# Altium integrated library Weidmueller_OMNIMATE_Power.IntLib: 508 symbols (part 8 of 9) (continued)
## 1930280000 (continued)
OMNIMATE Power - series BV/SV 7.62HP; PartNumber: 1930280000; Manufacturer: Weidmueller; Short_text_for_material: SV 7.62HP/03/90G 3.5SN BK BX; Side_termination_characteristic: closed side; Mounting_onto_the_PCB: Solder connection; Pitch_mm: 7.62 mm; Pitch_inch: 0.3 inch; No_of_poles: 3; Outgoing_elbow: 90°; Solder_pin_length_mm: 3.5 mm; Contact_material: Cu-Leg; Contact_surface: tinned; Insulating_material: PA GF; UL_94_flammability_rating: V-0; Rated_voltage_for_surge_voltage_class_pollution_degree_II_2: 1000 V; Rated_voltage_use_group_B_UL_1059: 300 V; Rated_current_use_group_B_UL_1059: 40.5 A; PackageReference: SV_7_62HP_90G_03; Colour: Black; Packaging: Box; Qty: 78 PCS; Revision: V1; ComponentLink1Description: Manufacturer URL; ComponentLink1URL: http://www.weidmueller.com/; ComponentLink2Description: URL Link1; ComponentLink2URL: http://catalog.weidmueller.com/catalog/Start.do?localeId=en&ObjectID=1930280000
footprint SV_7_62HP_90G_03 (OMNIMATE Power - Serie BV/SV 7.62HP  SV 7.62HP/03/90G 3.5)
pins: A1, A2, A3

## 1930280000_Single
designator J?
OMNIMATE Power - series BV/SV 7.62HP; PartNumber: 1930280000; Manufacturer: Weidmueller; Short_text_for_material: SV 7.62HP/03/90G 3.5SN BK BX; Side_termination_characteristic: closed side; Mounting_onto_the_PCB: Solder connection; Pitch_mm: 7.62 mm; Pitch_inch: 0.3 inch; No_of_poles: 3; Outgoing_elbow: 90°; Solder_pin_length_mm: 3.5 mm; Contact_material: Cu-Leg; Contact_surface: tinned; Insulating_material: PA GF; UL_94_flammability_rating: V-0; Rated_voltage_for_surge_voltage_class_pollution_degree_II_2: 1000 V; Rated_voltage_use_group_B_UL_1059: 300 V; Rated_current_use_group_B_UL_1059: 40.5 A; PackageReference: SV_7_62HP_90G_03; Colour: Black; Packaging: Box; Qty: 78 PCS; Revision: V1; ComponentLink1Description: Manufacturer URL; ComponentLink1URL: http://www.weidmueller.com/; ComponentLink2Description: URL Link1; ComponentLink2URL: http://catalog.weidmueller.com/catalog/Start.do?localeId=en&ObjectID=1930280000
footprint SV_7_62HP_90G_03 (OMNIMATE Power - Serie BV/SV 7.62HP  SV 7.62HP/03/90G 3.5)
part A pins: A1
part B pins: A2
part C pins: A3

## 1930290000
designator J?
OMNIMATE Power - series BV/SV 7.62HP; PartNumber: 1930290000; Manufacturer: Weidmueller; Short_text_for_material: SV 7.62HP/04/90G 3.5SN BK BX; Side_termination_characteristic: closed side; Mounting_onto_the_PCB: Solder connection; Pitch_mm: 7.62 mm; Pitch_inch: 0.3 inch; No_of_poles: 4; Outgoing_elbow: 90°; Solder_pin_length_mm: 3.5 mm; Contact_material: Cu-Leg; Contact_surface: tinned; Insulating_material: PA GF; UL_94_flammability_rating: V-0; Rated_voltage_for_surge_voltage_class_pollution_degree_II_2: 1000 V; Rated_voltage_use_group_B_UL_1059: 300 V; Rated_current_use_group_B_UL_1059: 40.5 A; PackageReference: SV_7_62HP_90G_04; Colour: Black; Packaging: Box; Qty: 60 PCS; Revision: V1; ComponentLink1Description: Manufacturer URL; ComponentLink1URL: http://www.weidmueller.com/; ComponentLink2Description: URL Link1; ComponentLink2URL: http://catalog.weidmueller.com/catalog/Start.do?localeId=en&ObjectID=1930290000
footprint SV_7_62HP_90G_04 (OMNIMATE Power - Serie BV/SV 7.62HP  SV 7.62HP/04/90G 3.5)
pins: A1, A2, A3, A4

## 1930290000_Single
designator J?
OMNIMATE Power - series BV/SV 7.62HP; PartNumber: 1930290000; Manufacturer: Weidmueller; Short_text_for_material: SV 7.62HP/04/90G 3.5SN BK BX; Side_termination_characteristic: closed side; Mounting_onto_the_PCB: Solder connection; Pitch_mm: 7.62 mm; Pitch_inch: 0.3 inch; No_of_poles: 4; Outgoing_elbow: 90°; Solder_pin_length_mm: 3.5 mm; Contact_material: Cu-Leg; Contact_surface: tinned; Insulating_material: PA GF; UL_94_flammability_rating: V-0; Rated_voltage_for_surge_voltage_class_pollution_degree_II_2: 1000 V; Rated_voltage_use_group_B_UL_1059: 300 V; Rated_current_use_group_B_UL_1059: 40.5 A; PackageReference: SV_7_62HP_90G_04; Colour: Black; Packaging: Box; Qty: 60 PCS; Revision: V1; ComponentLink1Description: Manufacturer URL; ComponentLink1URL: http://www.weidmueller.com/; ComponentLink2Description: URL Link1; ComponentLink2URL: http://catalog.weidmueller.com/catalog/Start.do?localeId=en&ObjectID=1930290000
footprint SV_7_62HP_90G_04 (OMNIMATE Power - Serie BV/SV 7.62HP  SV 7.62HP/04/90G 3.5)
part A pins: A1
part B pins: A2
part C pins: A3
part D pins: A4

## 1930380000
designator J?
OMNIMATE Power - series BV/SV 7.62HP; PartNumber: 1930380000; Manufacturer: Weidmueller; Short_text_for_material: SV 7.62HP/02/90F 3.5SN BK BX; Side_termination_characteristic: Clip-on flange; Mounting_onto_the_PCB: Solder connection; Pitch_mm: 7.62 mm; Pitch_inch: 0.3 inch; No_of_poles: 2; Outgoing_elbow: 90°; Solder_pin_length_mm: 3.5 mm; Contact_material: Cu-Leg; Contact_surface: tinned; Insulating_material: PA GF; UL_94_flammability_rating: V-0; Rated_voltage_for_surge_voltage_class_pollution_degree_II_2: 1000 V; Rated_voltage_use_group_B_UL_1059: 300 V; Rated_current_use_group_B_UL_1059: 40.5 A; PackageReference: SV_7_62HP_90F_02; Colour: Black; Packaging: Box; Qty: 100 PCS; Revision: V1; ComponentLink1Description: Manufacturer URL; ComponentLink1URL: http://www.weidmueller.com/; ComponentLink2Description: URL Link1; ComponentLink2URL: http://catalog.weidmueller.com/catalog/Start.do?localeId=en&ObjectID=1930380000
footprint SV_7_62HP_90F_02 (OMNIMATE Power - Serie BV/SV 7.62HP  SV 7.62HP/02/90F 3.5)
pins: A1, A2

## 1930380000_Single
designator J?
OMNIMATE Power - series BV/SV 7.62HP; PartNumber: 1930380000; Manufacturer: Weidmueller; Short_text_for_material: SV 7.62HP/02/90F 3.5SN BK BX; Side_termination_characteristic: Clip-on flange; Mounting_onto_the_PCB: Solder connection; Pitch_mm: 7.62 mm; Pitch_inch: 0.3 inch; No_of_poles: 2; Outgoing_elbow: 90°; Solder_pin_length_mm: 3.5 mm; Contact_material: Cu-Leg; Contact_surface: tinned; Insulating_material: PA GF; UL_94_flammability_rating: V-0; Rated_voltage_for_surge_voltage_class_pollution_degree_II_2: 1000 V; Rated_voltage_use_group_B_UL_1059: 300 V; Rated_current_use_group_B_UL_1059: 40.5 A; PackageReference: SV_7_62HP_90F_02; Colour: Black; Packaging: Box; Qty: 100 PCS; Revision: V1; ComponentLink1Description: Manufacturer URL; ComponentLink1URL: http://www.weidmueller.com/; ComponentLink2Description: URL Link1; ComponentLink2URL: http://catalog.weidmueller.com/catalog/Start.do?localeId=en&ObjectID=1930380000
footprint SV_7_62HP_90F_02 (OMNIMATE Power - Serie BV/SV 7.62HP  SV 7.62HP/02/90F 3.5)
part A pins: A1
part B pins: A2

## 1930390000
designator J?
OMNIMATE Power - series BV/SV 7.62HP; PartNumber: 1930390000; Manufacturer: Weidmueller; Short_text_for_material: SV 7.62HP/03/90F 3.5SN BK BX; Side_termination_characteristic: Clip-on flange; Mounting_onto_the_PCB: Solder connection; Pitch_mm: 7.62 mm; Pitch_inch: 0.3 inch; No_of_poles: 3; Outgoing_elbow: 90°; Solder_pin_length_mm: 3.5 mm; Contact_material: Cu-Leg; Contact_surface: tinned; Insulating_material: PA GF; UL_94_flammability_rating: V-0; Rated_voltage_for_surge_voltage_class_pollution_degree_II_2: 1000 V; Rated_voltage_use_group_B_UL_1059: 300 V; Rated_current_use_group_B_UL_1059: 40.5 A; PackageReference: SV_7_62HP_90F_03; Colour: Black; Packaging: Box; Qty: 48 PCS; Revision: V1; ComponentLink1Description: Manufacturer URL; ComponentLink1URL: http://www.weidmueller.com/; ComponentLink2Description: URL Link1; ComponentLink2URL: http://catalog.weidmueller.com/catalog/Start.do?localeId=en&ObjectID=1930390000
footprint SV_7_62HP_90F_03 (OMNIMATE Power - Serie BV/SV 7.62HP  SV 7.62HP/03/90F 3.5)
pins: A1, A2, A3

## 1930390000_Single
designator J?
OMNIMATE Power - series BV/SV 7.62HP; PartNumber: 1930390000; Manufacturer: Weidmueller; Short_text_for_material: SV 7.62HP/03/90F 3.5SN BK BX; Side_termination_characteristic: Clip-on flange; Mounting_onto_the_PCB: Solder connection; Pitch_mm: 7.62 mm; Pitch_inch: 0.3 inch; No_of_poles: 3; Outgoing_elbow: 90°; Solder_pin_length_mm: 3.5 mm; Contact_material: Cu-Leg; Contact_surface: tinned; Insulating_material: PA GF; UL_94_flammability_rating: V-0; Rated_voltage_for_surge_voltage_class_pollution_degree_II_2: 1000 V; Rated_voltage_use_group_B_UL_1059: 300 V; Rated_current_use_group_B_UL_1059: 40.5 A; PackageReference: SV_7_62HP_90F_03; Colour: Black; Packaging: Box; Qty: 48 PCS; Revision: V1; ComponentLink1Description: Manufacturer URL; ComponentLink1URL: http://www.weidmueller.com/; ComponentLink2Description: URL Link1; ComponentLink2URL: http://catalog.weidmueller.com/catalog/Start.do?localeId=en&ObjectID=1930390000
footprint SV_7_62HP_90F_03 (OMNIMATE Power - Serie BV/SV 7.62HP  SV 7.62HP/03/90F 3.5)
part A pins: A1
part B pins: A2
part C pins: A3

## 1930400000
designator J?
OMNIMATE Power - series BV/SV 7.62HP; PartNumber: 1930400000; Manufacturer: Weidmueller; Short_text_for_material: SV 7.62HP/04/90F 3.5SN BK BX; Side_termination_characteristic: Clip-on flange; Mounting_onto_the_PCB: Solder connection; Pitch_mm: 7.62 mm; Pitch_inch: 0.3 inch; No_of_poles: 4; Outgoing_elbow: 90°; Solder_pin_length_mm: 3.5 mm; Contact_material: Cu-Leg; Contact_surface: tinned; Insulating_material: PA GF; UL_94_flammability_rating: V-0; Rated_voltage_for_surge_voltage_class_pollution_degree_II_2: 1000 V; Rated_voltage_use_group_B_UL_1059: 300 V; Rated_current_use_group_B_UL_1059: 40.5 A; PackageReference: SV_7_62HP_90F_04; Colour: Black; Packaging: Box; Qty: 36 PCS; Revision: V1; ComponentLink1Description: Manufacturer URL; ComponentLink1URL: http://www.weidmueller.com/; ComponentLink2Description: URL Link1; ComponentLink2URL: http://catalog.weidmueller.com/catalog/Start.do?localeId=en&ObjectID=1930400000
footprint SV_7_62HP_90F_04 (OMNIMATE Power - Serie BV/SV 7.62HP  SV 7.62HP/04/90F 3.5)
pins: A1, A2, A3, A4

## 1930400000_Single
designator J?
OMNIMATE Power - series BV/SV 7.62HP; PartNumber: 1930400000; Manufacturer: Weidmueller; Short_text_for_material: SV 7.62HP/04/90F 3.5SN BK BX; Side_termination_characteristic: Clip-on flange; Mounting_onto_the_PCB: Solder connection; Pitch_mm: 7.62 mm; Pitch_inch: 0.3 inch; No_of_poles: 4; Outgoing_elbow: 90°; Solder_pin_length_mm: 3.5 mm; Contact_material: Cu-Leg; Contact_surface: tinned; Insulating_material: PA GF; UL_94_flammability_rating: V-0; Rated_voltage_for_surge_voltage_class_pollution_degree_II_2: 1000 V; Rated_voltage_use_group_B_UL_1059: 300 V; Rated_current_use_group_B_UL_1059: 40.5 A; PackageReference: SV_7_62HP_90F_04; Colour: Black; Packaging: Box; Qty: 36 PCS; Revision: V1; ComponentLink1Description: Manufacturer URL; ComponentLink1URL: http://www.weidmueller.com/; ComponentLink2Description: URL Link1; ComponentLink2URL: http://catalog.weidmueller.com/catalog/Start.do?localeId=en&ObjectID=1930400000
footprint SV_7_62HP_90F_04 (OMNIMATE Power - Serie BV/SV 7.62HP  SV 7.62HP/04/90F 3.5)
part A pins: A1
part B pins: A2
part C pins: A3
part D pins: A4

## 1930490000
designator J?
OMNIMATE Power - series BV/SV 7.62HP; PartNumber: 1930490000; Manufacturer: Weidmueller; Short_text_for_material: SV 7.62HP/02/90SF 3.5SN BK BX; Side_termination_characteristic: Screw/clip-on flange; Mounting_onto_the_PCB: Solder connection; Pitch_mm: 7.62 mm; Pitch_inch: 0.3 inch; No_of_poles: 2; Outgoing_elbow: 90°; Solder_pin_length_mm: 3.5 mm; Contact_material: Cu-Leg; Contact_surface: tinned; Insulating_material: PA GF; UL_94_flammability_rating: V-0; Rated_voltage_for_surge_voltage_class_pollution_degree_II_2: 1000 V; Rated_voltage_use_group_B_UL_1059: 300 V; Rated_current_use_group_B_UL_1059: 40.5 A; PackageReference: SV_7_62HP_90SF_02; Colour: Black; Packaging: Box; Qty: 100 PCS; Revision: V1; ComponentLink1Description: Manufacturer URL; ComponentLink1URL: http://www.weidmueller.com/; ComponentLink2Description: URL Link1; ComponentLink2URL: http://catalog.weidmueller.com/catalog/Start.do?localeId=en&ObjectID=1930490000
footprint SV_7_62HP_90SF_02 (OMNIMATE Power - Serie BV/SV 7.62HP  SV 7.62HP/02/90SF 3.5)
pins: A1, A2

## 1930490000_Single
designator J?
OMNIMATE Power - series BV/SV 7.62HP; PartNumber: 1930490000; Manufacturer: Weidmueller; Short_text_for_material: SV 7.62HP/02/90SF 3.5SN BK BX; Side_termination_characteristic: Screw/clip-on flange; Mounting_onto_the_PCB: Solder connection; Pitch_mm: 7.62 mm; Pitch_inch: 0.3 inch; No_of_poles: 2; Outgoing_elbow: 90°; Solder_pin_length_mm: 3.5 mm; Contact_material: Cu-Leg; Contact_surface: tinned; Insulating_material: PA GF; UL_94_flammability_rating: V-0; Rated_voltage_for_surge_voltage_class_pollution_degree_II_2: 1000 V; Rated_voltage_use_group_B_UL_1059: 300 V; Rated_current_use_group_B_UL_1059: 40.5 A; PackageReference: SV_7_62HP_90SF_02; Colour: Black; Packaging: Box; Qty: 100 PCS; Revision: V1; ComponentLink1Description: Manufacturer URL; ComponentLink1URL: http://www.weidmueller.com/; ComponentLink2Description: URL Link1; ComponentLink2URL: http://catalog.weidmueller.com/catalog/Start.do?localeId=en&ObjectID=1930490000
footprint SV_7_62HP_90SF_02 (OMNIMATE Power - Serie BV/SV 7.62HP  SV 7.62HP/02/90SF 3.5)
part A pins: A1
part B pins: A2

## 1930500000
designator J?
OMNIMATE Power - series BV/SV 7.62HP; PartNumber: 1930500000; Manufacturer: Weidmueller; Short_text_for_material: SV 7.62HP/03/90SF 3.5SN BK BX; Side_termination_characteristic: Screw/clip-on flange; Mounting_onto_the_PCB: Solder connection; Pitch_mm: 7.62 mm; Pitch_inch: 0.3 inch; No_of_poles: 3; Outgoing_elbow: 90°; Solder_pin_length_mm: 3.5 mm; Contact_material: Cu-Leg; Contact_surface: tinned; Insulating_material: PA GF; UL_94_flammability_rating: V-0; Rated_voltage_for_surge_voltage_class_pollution_degree_II_2: 1000 V; Rated_voltage_use_group_B_UL_1059: 300 V; Rated_current_use_group_B_UL_1059: 40.5 A; PackageReference: SV_7_62HP_90SF_03; Colour: Black; Packaging: Box; Qty: 100 PCS; Revision: V1; ComponentLink1Description: Manufacturer URL; ComponentLink1URL: http://www.weidmueller.com/; ComponentLink2Description: URL Link1; ComponentLink2URL: http://catalog.weidmueller.com/catalog/Start.do?localeId=en&ObjectID=1930500000
footprint SV_7_62HP_90SF_03 (OMNIMATE Power - Serie BV/SV 7.62HP  SV 7.62HP/03/90SF 3.5)
pins: A1, A2, A3

## 1930500000_Single
designator J?
OMNIMATE Power - series BV/SV 7.62HP; PartNumber: 1930500000; Manufacturer: Weidmueller; Short_text_for_material: SV 7.62HP/03/90SF 3.5SN BK BX; Side_termination_characteristic: Screw/clip-on flange; Mounting_onto_the_PCB: Solder connection; Pitch_mm: 7.62 mm; Pitch_inch: 0.3 inch; No_of_poles: 3; Outgoing_elbow: 90°; Solder_pin_length_mm: 3.5 mm; Contact_material: Cu-Leg; Contact_surface: tinned; Insulating_material: PA GF; UL_94_flammability_rating: V-0; Rated_voltage_for_surge_voltage_class_pollution_degree_II_2: 1000 V; Rated_voltage_use_group_B_UL_1059: 300 V; Rated_current_use_group_B_UL_1059: 40.5 A; PackageReference: SV_7_62HP_90SF_03; Colour: Black; Packaging: Box; Qty: 100 PCS; Revision: V1; ComponentLink1Description: Manufacturer URL; ComponentLink1URL: http://www.weidmueller.com/; ComponentLink2Description: URL Link1; ComponentLink2URL: http://catalog.weidmueller.com/catalog/Start.do?localeId=en&ObjectID=1930500000
footprint SV_7_62HP_90SF_03 (OMNIMATE Power - Serie BV/SV 7.62HP  SV 7.62HP/03/90SF 3.5)
part A pins: A1
part B pins: A2
part C pins: A3

## 1930510000
designator J?
OMNIMATE Power - series BV/SV 7.62HP; PartNumber: 1930510000; Manufacturer: Weidmueller; Short_text_for_material: SV 7.62HP/04/90SF 3.5SN BK BX; Side_termination_characteristic: Screw/clip-on flange; Mounting_onto_the_PCB: Solder connection; Pitch_mm: 7.62 mm; Pitch_inch: 0.3 inch; No_of_poles: 4; Outgoing_elbow: 90°; Solder_pin_length_mm: 3.5 mm; Contact_material: Cu-Leg; Contact_surface: tinned; Insulating_material: PA GF; UL_94_flammability_rating: V-0; Rated_voltage_for_surge_voltage_class_pollution_degree_II_2: 1000 V; Rated_voltage_use_group_B_UL_1059: 300 V; Rated_current_use_group_B_UL_1059: 40.5 A; PackageReference: SV_7_62HP_90SF_04; Colour: Black; Packaging: Box; Qty: 100 PCS; Revision: V1; ComponentLink1Description: Manufacturer URL; ComponentLink1URL: http://www.weidmueller.com/; ComponentLink2Description: URL Link1; ComponentLink2URL: http://catalog.weidmueller.com/catalog/Start.do?localeId=en&ObjectID=1930510000
footprint SV_7_62HP_90SF_04 (OMNIMATE Power - Serie BV/SV 7.62HP  SV 7.62HP/04/90SF 3.5)
pins: A1, A2, A3, A4

## 1930510000_Single
designator J?
OMNIMATE Power - series BV/SV 7.62HP; PartNumber: 1930510000; Manufacturer: Weidmueller; Short_text_for_material: SV 7.62HP/04/90SF 3.5SN BK BX; Side_termination_characteristic: Screw/clip-on flange; Mounting_onto_the_PCB: Solder connection; Pitch_mm: 7.62 mm; Pitch_inch: 0.3 inch; No_of_poles: 4; Outgoing_elbow: 90°; Solder_pin_length_mm: 3.5 mm; Contact_material: Cu-Leg; Contact_surface: tinned; Insulating_material: PA GF; UL_94_flammability_rating: V-0; Rated_voltage_for_surge_voltage_class_pollution_degree_II_2: 1000 V; Rated_voltage_use_group_B_UL_1059: 300 V; Rated_current_use_group_B_UL_1059: 40.5 A; PackageReference: SV_7_62HP_90SF_04; Colour: Black; Packaging: Box; Qty: 100 PCS; Revision: V1; ComponentLink1Description: Manufacturer URL; ComponentLink1URL: http://www.weidmueller.com/; ComponentLink2Description: URL Link1; ComponentLink2URL: http://catalog.weidmueller.com/catalog/Start.do?localeId=en&ObjectID=1930510000
footprint SV_7_62HP_90SF_04 (OMNIMATE Power - Serie BV/SV 7.62HP  SV 7.62HP/04/90SF 3.5)
part A pins: A1
part B pins: A2
part C pins: A3
part D pins: A4

## 1930600000
designator J?
OMNIMATE Power - series BV/SV 7.62HP; PartNumber: 1930600000; Manufacturer: Weidmueller; Short_text_for_material: SV 7.62HP/02/180G 3.5SN BK BX; Side_termination_characteristic: closed side; Mounting_onto_the_PCB: Solder connection; Pitch_mm: 7.62 mm; Pitch_inch: 0.3 inch; No_of_poles: 2; Outgoing_elbow: 180°; Solder_pin_length_mm: 3.5 mm; Contact_material: Cu-Leg; Contact_surface: tinned; Insulating_material: PA GF; UL_94_flammability_rating: V-0; Rated_voltage_for_surge_voltage_class_pollution_degree_II_2: 1000 V; Rated_voltage_use_group_B_UL_1059: 300 V; Rated_current_use_group_B_UL_1059: 40.5 A; PackageReference: SV_7_62HP_180G_02; Colour: Black; Packaging: Box; Qty: 120 PCS; Revision: V1; ComponentLink1Description: Manufacturer URL; ComponentLink1URL: http://www.weidmueller.com/; ComponentLink2Description: URL Link1; ComponentLink2URL: http://catalog.weidmueller.com/catalog/Start.do?localeId=en&ObjectID=1930600000
footprint SV_7_62HP_180G_02 (OMNIMATE Power - Serie BV/SV 7.62HP  SV 7.62HP/02/180G 3.5)
pins: A1, A2

## 1930600000_Single
designator J?
OMNIMATE Power - series BV/SV 7.62HP; PartNumber: 1930600000; Manufacturer: Weidmueller; Short_text_for_material: SV 7.62HP/02/180G 3.5SN BK BX; Side_termination_characteristic: closed side; Mounting_onto_the_PCB: Solder connection; Pitch_mm: 7.62 mm; Pitch_inch: 0.3 inch; No_of_poles: 2; Outgoing_elbow: 180°; Solder_pin_length_mm: 3.5 mm; Contact_material: Cu-Leg; Contact_surface: tinned; Insulating_material: PA GF; UL_94_flammability_rating: V-0; Rated_voltage_for_surge_voltage_class_pollution_degree_II_2: 1000 V; Rated_voltage_use_group_B_UL_1059: 300 V; Rated_current_use_group_B_UL_1059: 40.5 A; PackageReference: SV_7_62HP_180G_02; Colour: Black; Packaging: Box; Qty: 120 PCS; Revision: V1; ComponentLink1Description: Manufacturer URL; ComponentLink1URL: http://www.weidmueller.com/; ComponentLink2Description: URL Link1; ComponentLink2URL: http://catalog.weidmueller.com/catalog/Start.do?localeId=en&ObjectID=1930600000
footprint SV_7_62HP_180G_02 (OMNIMATE Power - Serie BV/SV 7.62HP  SV 7.62HP/02/180G 3.5)
part A pins: A1
part B pins: A2

## 1930610000
designator J?
OMNIMATE Power - series BV/SV 7.62HP; PartNumber: 1930610000; Manufacturer: Weidmueller; Short_text_for_material: SV 7.62HP/03/180G 3.5SN BK BX; Side_termination_characteristic: closed side; Mounting_onto_the_PCB: Solder connection; Pitch_mm: 7.62 mm; Pitch_inch: 0.3 inch; No_of_poles: 3; Outgoing_elbow: 180°; Solder_pin_length_mm: 3.5 mm; Contact_material: Cu-Leg; Contact_surface: tinned; Insulating_material: PA GF; UL_94_flammability_rating: V-0; Rated_voltage_for_surge_voltage_class_pollution_degree_II_2: 1000 V; Rated_voltage_use_group_B_UL_1059: 300 V; Rated_current_use_group_B_UL_1059: 40.5 A; PackageReference: SV_7_62HP_180G_03; Colour: Black; Packaging: Box; Qty: 78 PCS; Revision: V1; ComponentLink1Description: Manufacturer URL; ComponentLink1URL: http://www.weidmueller.com/; ComponentLink2Description: URL Link1; ComponentLink2URL: http://catalog.weidmueller.com/catalog/Start.do?localeId=en&ObjectID=1930610000
footprint SV_7_62HP_180G_03 (OMNIMATE Power - Serie BV/SV 7.62HP  SV 7.62HP/03/180G 3.5)
pins: A1, A2, A3

## 1930610000_Single
designator J?
OMNIMATE Power - series BV/SV 7.62HP; PartNumber: 1930610000; Manufacturer: Weidmueller; Short_text_for_material: SV 7.62HP/03/180G 3.5SN BK BX; Side_termination_characteristic: closed side; Mounting_onto_the_PCB: Solder connection; Pitch_mm: 7.62 mm; Pitch_inch: 0.3 inch; No_of_poles: 3; Outgoing_elbow: 180°; Solder_pin_length_mm: 3.5 mm; Contact_material: Cu-Leg; Contact_surface: tinned; Insulating_material: PA GF; UL_94_flammability_rating: V-0; Rated_voltage_for_surge_voltage_class_pollution_degree_II_2: 1000 V; Rated_voltage_use_group_B_UL_1059: 300 V; Rated_current_use_group_B_UL_1059: 40.5 A; PackageReference: SV_7_62HP_180G_03; Colour: Black; Packaging: Box; Qty: 78 PCS; Revision: V1; ComponentLink1Description: Manufacturer URL; ComponentLink1URL: http://www.weidmueller.com/; ComponentLink2Description: URL Link1; ComponentLink2URL: http://catalog.weidmueller.com/catalog/Start.do?localeId=en&ObjectID=1930610000
footprint SV_7_62HP_180G_03 (OMNIMATE Power - Serie BV/SV 7.62HP  SV 7.62HP/03/180G 3.5)
part A pins: A1
part B pins: A2
part C pins: A3

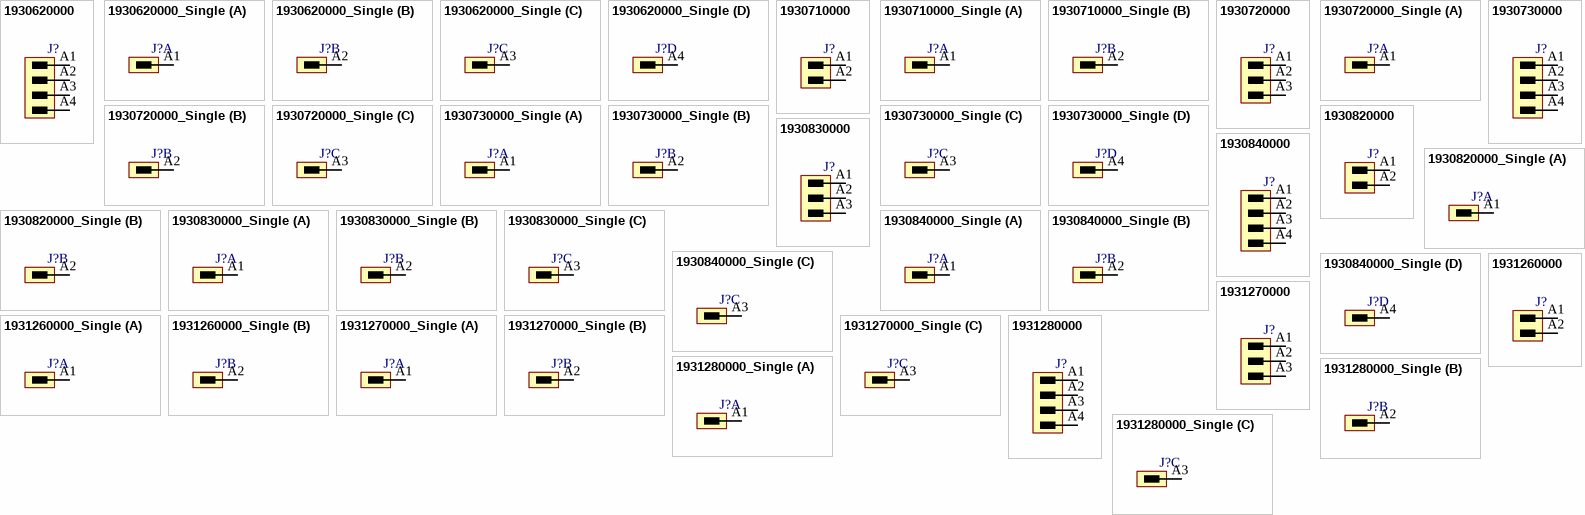
[diagram p29: symbols 1930620000 to 1931280000_Single]

## 1930620000
designator J?
OMNIMATE Power - series BV/SV 7.62HP; PartNumber: 1930620000; Manufacturer: Weidmueller; Short_text_for_material: SV 7.62HP/04/180G 3.5SN BK BX; Side_termination_characteristic: closed side; Mounting_onto_the_PCB: Solder connection; Pitch_mm: 7.62 mm; Pitch_inch: 0.3 inch; No_of_poles: 4; Outgoing_elbow: 180°; Solder_pin_length_mm: 3.5 mm; Contact_material: Cu-Leg; Contact_surface: tinned; Insulating_material: PA GF; UL_94_flammability_rating: V-0; Rated_voltage_for_surge_voltage_class_pollution_degree_II_2: 1000 V; Rated_voltage_use_group_B_UL_1059: 300 V; Rated_current_use_group_B_UL_1059: 40.5 A; PackageReference: SV_7_62HP_180G_04; Colour: Black; Packaging: Box; Qty: 60 PCS; Revision: V1; ComponentLink1Description: Manufacturer URL; ComponentLink1URL: http://www.weidmueller.com/; ComponentLink2Description: URL Link1; ComponentLink2URL: http://catalog.weidmueller.com/catalog/Start.do?localeId=en&ObjectID=1930620000
footprint SV_7_62HP_180G_04 (OMNIMATE Power - Serie BV/SV 7.62HP  SV 7.62HP/04/180G 3.5)
pins: A1, A2, A3, A4

## 1930620000_Single
designator J?
OMNIMATE Power - series BV/SV 7.62HP; PartNumber: 1930620000; Manufacturer: Weidmueller; Short_text_for_material: SV 7.62HP/04/180G 3.5SN BK BX; Side_termination_characteristic: closed side; Mounting_onto_the_PCB: Solder connection; Pitch_mm: 7.62 mm; Pitch_inch: 0.3 inch; No_of_poles: 4; Outgoing_elbow: 180°; Solder_pin_length_mm: 3.5 mm; Contact_material: Cu-Leg; Contact_surface: tinned; Insulating_material: PA GF; UL_94_flammability_rating: V-0; Rated_voltage_for_surge_voltage_class_pollution_degree_II_2: 1000 V; Rated_voltage_use_group_B_UL_1059: 300 V; Rated_current_use_group_B_UL_1059: 40.5 A; PackageReference: SV_7_62HP_180G_04; Colour: Black; Packaging: Box; Qty: 60 PCS; Revision: V1; ComponentLink1Description: Manufacturer URL; ComponentLink1URL: http://www.weidmueller.com/; ComponentLink2Description: URL Link1; ComponentLink2URL: http://catalog.weidmueller.com/catalog/Start.do?localeId=en&ObjectID=1930620000
footprint SV_7_62HP_180G_04 (OMNIMATE Power - Serie BV/SV 7.62HP  SV 7.62HP/04/180G 3.5)
part A pins: A1
part B pins: A2
part C pins: A3
part D pins: A4

## 1930710000
designator J?
OMNIMATE Power - series BV/SV 7.62HP; PartNumber: 1930710000; Manufacturer: Weidmueller; Short_text_for_material: SV 7.62HP/02/180F 3.5SN BK BX; Side_termination_characteristic: Clip-on flange; Mounting_onto_the_PCB: Solder connection; Pitch_mm: 7.62 mm; Pitch_inch: 0.3 inch; No_of_poles: 2; Outgoing_elbow: 180°; Solder_pin_length_mm: 3.5 mm; Contact_material: Cu-Leg; Contact_surface: tinned; Insulating_material: PA GF; UL_94_flammability_rating: V-0; Rated_voltage_for_surge_voltage_class_pollution_degree_II_2: 1000 V; Rated_voltage_use_group_B_UL_1059: 300 V; Rated_current_use_group_B_UL_1059: 40.5 A; PackageReference: SV_7_62HP_180F_02; Colour: Black; Packaging: Box; Qty: 60 PCS; Revision: V1; ComponentLink1Description: Manufacturer URL; ComponentLink1URL: http://www.weidmueller.com/; ComponentLink2Description: URL Link1; ComponentLink2URL: http://catalog.weidmueller.com/catalog/Start.do?localeId=en&ObjectID=1930710000
footprint SV_7_62HP_180F_02 (OMNIMATE Power - Serie BV/SV 7.62HP  SV 7.62HP/02/180F 3.5)
pins: A1, A2

## 1930710000_Single
designator J?
OMNIMATE Power - series BV/SV 7.62HP; PartNumber: 1930710000; Manufacturer: Weidmueller; Short_text_for_material: SV 7.62HP/02/180F 3.5SN BK BX; Side_termination_characteristic: Clip-on flange; Mounting_onto_the_PCB: Solder connection; Pitch_mm: 7.62 mm; Pitch_inch: 0.3 inch; No_of_poles: 2; Outgoing_elbow: 180°; Solder_pin_length_mm: 3.5 mm; Contact_material: Cu-Leg; Contact_surface: tinned; Insulating_material: PA GF; UL_94_flammability_rating: V-0; Rated_voltage_for_surge_voltage_class_pollution_degree_II_2: 1000 V; Rated_voltage_use_group_B_UL_1059: 300 V; Rated_current_use_group_B_UL_1059: 40.5 A; PackageReference: SV_7_62HP_180F_02; Colour: Black; Packaging: Box; Qty: 60 PCS; Revision: V1; ComponentLink1Description: Manufacturer URL; ComponentLink1URL: http://www.weidmueller.com/; ComponentLink2Description: URL Link1; ComponentLink2URL: http://catalog.weidmueller.com/catalog/Start.do?localeId=en&ObjectID=1930710000
footprint SV_7_62HP_180F_02 (OMNIMATE Power - Serie BV/SV 7.62HP  SV 7.62HP/02/180F 3.5)
part A pins: A1
part B pins: A2

## 1930720000
designator J?
OMNIMATE Power - series BV/SV 7.62HP; PartNumber: 1930720000; Manufacturer: Weidmueller; Short_text_for_material: SV 7.62HP/03/180F 3.5SN BK BX; Side_termination_characteristic: Clip-on flange; Mounting_onto_the_PCB: Solder connection; Pitch_mm: 7.62 mm; Pitch_inch: 0.3 inch; No_of_poles: 3; Outgoing_elbow: 180°; Solder_pin_length_mm: 3.5 mm; Contact_material: Cu-Leg; Contact_surface: tinned; Insulating_material: PA GF; UL_94_flammability_rating: V-0; Rated_voltage_for_surge_voltage_class_pollution_degree_II_2: 1000 V; Rated_voltage_use_group_B_UL_1059: 300 V; Rated_current_use_group_B_UL_1059: 40.5 A; PackageReference: SV_7_62HP_180F_03; Colour: Black; Packaging: Box; Qty: 48 PCS; Revision: V1; ComponentLink1Description: Manufacturer URL; ComponentLink1URL: http://www.weidmueller.com/; ComponentLink2Description: URL Link1; ComponentLink2URL: http://catalog.weidmueller.com/catalog/Start.do?localeId=en&ObjectID=1930720000
footprint SV_7_62HP_180F_03 (OMNIMATE Power - Serie BV/SV 7.62HP  SV 7.62HP/03/180F 3.5)
pins: A1, A2, A3

## 1930720000_Single
designator J?
OMNIMATE Power - series BV/SV 7.62HP; PartNumber: 1930720000; Manufacturer: Weidmueller; Short_text_for_material: SV 7.62HP/03/180F 3.5SN BK BX; Side_termination_characteristic: Clip-on flange; Mounting_onto_the_PCB: Solder connection; Pitch_mm: 7.62 mm; Pitch_inch: 0.3 inch; No_of_poles: 3; Outgoing_elbow: 180°; Solder_pin_length_mm: 3.5 mm; Contact_material: Cu-Leg; Contact_surface: tinned; Insulating_material: PA GF; UL_94_flammability_rating: V-0; Rated_voltage_for_surge_voltage_class_pollution_degree_II_2: 1000 V; Rated_voltage_use_group_B_UL_1059: 300 V; Rated_current_use_group_B_UL_1059: 40.5 A; PackageReference: SV_7_62HP_180F_03; Colour: Black; Packaging: Box; Qty: 48 PCS; Revision: V1; ComponentLink1Description: Manufacturer URL; ComponentLink1URL: http://www.weidmueller.com/; ComponentLink2Description: URL Link1; ComponentLink2URL: http://catalog.weidmueller.com/catalog/Start.do?localeId=en&ObjectID=1930720000
footprint SV_7_62HP_180F_03 (OMNIMATE Power - Serie BV/SV 7.62HP  SV 7.62HP/03/180F 3.5)
part A pins: A1
part B pins: A2
part C pins: A3

## 1930730000
designator J?
OMNIMATE Power - series BV/SV 7.62HP; PartNumber: 1930730000; Manufacturer: Weidmueller; Short_text_for_material: SV 7.62HP/04/180F 3.5SN BK BX; Side_termination_characteristic: Clip-on flange; Mounting_onto_the_PCB: Solder connection; Pitch_mm: 7.62 mm; Pitch_inch: 0.3 inch; No_of_poles: 4; Outgoing_elbow: 180°; Solder_pin_length_mm: 3.5 mm; Contact_material: Cu-Leg; Contact_surface: tinned; Insulating_material: PA GF; UL_94_flammability_rating: V-0; Rated_voltage_for_surge_voltage_class_pollution_degree_II_2: 1000 V; Rated_voltage_use_group_B_UL_1059: 300 V; Rated_current_use_group_B_UL_1059: 40.5 A; PackageReference: SV_7_62HP_180F_04; Colour: Black; Packaging: Box; Qty: 36 PCS; Revision: V1; ComponentLink1Description: Manufacturer URL; ComponentLink1URL: http://www.weidmueller.com/; ComponentLink2Description: URL Link1; ComponentLink2URL: http://catalog.weidmueller.com/catalog/Start.do?localeId=en&ObjectID=1930730000
footprint SV_7_62HP_180F_04 (OMNIMATE Power - Serie BV/SV 7.62HP  SV 7.62HP/04/180F 3.5)
pins: A1, A2, A3, A4

## 1930730000_Single
designator J?
OMNIMATE Power - series BV/SV 7.62HP; PartNumber: 1930730000; Manufacturer: Weidmueller; Short_text_for_material: SV 7.62HP/04/180F 3.5SN BK BX; Side_termination_characteristic: Clip-on flange; Mounting_onto_the_PCB: Solder connection; Pitch_mm: 7.62 mm; Pitch_inch: 0.3 inch; No_of_poles: 4; Outgoing_elbow: 180°; Solder_pin_length_mm: 3.5 mm; Contact_material: Cu-Leg; Contact_surface: tinned; Insulating_material: PA GF; UL_94_flammability_rating: V-0; Rated_voltage_for_surge_voltage_class_pollution_degree_II_2: 1000 V; Rated_voltage_use_group_B_UL_1059: 300 V; Rated_current_use_group_B_UL_1059: 40.5 A; PackageReference: SV_7_62HP_180F_04; Colour: Black; Packaging: Box; Qty: 36 PCS; Revision: V1; ComponentLink1Description: Manufacturer URL; ComponentLink1URL: http://www.weidmueller.com/; ComponentLink2Description: URL Link1; ComponentLink2URL: http://catalog.weidmueller.com/catalog/Start.do?localeId=en&ObjectID=1930730000
footprint SV_7_62HP_180F_04 (OMNIMATE Power - Serie BV/SV 7.62HP  SV 7.62HP/04/180F 3.5)
part A pins: A1
part B pins: A2
part C pins: A3
part D pins: A4

## 1930820000
designator J?
OMNIMATE Power - series BV/SV 7.62HP; PartNumber: 1930820000; Manufacturer: Weidmueller; Short_text_for_material: SV 7.62HP/02/180SF 3.5SN BK BX; Side_termination_characteristic: Screw/clip-on flange; Mounting_onto_the_PCB: Solder connection; Pitch_mm: 7.62 mm; Pitch_inch: 0.3 inch; No_of_poles: 2; Outgoing_elbow: 180°; Solder_pin_length_mm: 3.5 mm; Contact_material: Cu-Leg; Contact_surface: tinned; Insulating_material: PA GF; UL_94_flammability_rating: V-0; Rated_voltage_for_surge_voltage_class_pollution_degree_II_2: 1000 V; Rated_voltage_use_group_B_UL_1059: 300 V; Rated_current_use_group_B_UL_1059: 40.5 A; PackageReference: SV_7_62HP_180SF_02; Colour: Black; Packaging: Box; Qty: 60 PCS; Revision: V1; ComponentLink1Description: Manufacturer URL; ComponentLink1URL: http://www.weidmueller.com/; ComponentLink2Description: URL Link1; ComponentLink2URL: http://catalog.weidmueller.com/catalog/Start.do?localeId=en&ObjectID=1930820000
footprint SV_7_62HP_180SF_02 (OMNIMATE Power - Serie BV/SV 7.62HP  SV 7.62HP/02/180SF 3.5)
pins: A1, A2

## 1930820000_Single
designator J?
OMNIMATE Power - series BV/SV 7.62HP; PartNumber: 1930820000; Manufacturer: Weidmueller; Short_text_for_material: SV 7.62HP/02/180SF 3.5SN BK BX; Side_termination_characteristic: Screw/clip-on flange; Mounting_onto_the_PCB: Solder connection; Pitch_mm: 7.62 mm; Pitch_inch: 0.3 inch; No_of_poles: 2; Outgoing_elbow: 180°; Solder_pin_length_mm: 3.5 mm; Contact_material: Cu-Leg; Contact_surface: tinned; Insulating_material: PA GF; UL_94_flammability_rating: V-0; Rated_voltage_for_surge_voltage_class_pollution_degree_II_2: 1000 V; Rated_voltage_use_group_B_UL_1059: 300 V; Rated_current_use_group_B_UL_1059: 40.5 A; PackageReference: SV_7_62HP_180SF_02; Colour: Black; Packaging: Box; Qty: 60 PCS; Revision: V1; ComponentLink1Description: Manufacturer URL; ComponentLink1URL: http://www.weidmueller.com/; ComponentLink2Description: URL Link1; ComponentLink2URL: http://catalog.weidmueller.com/catalog/Start.do?localeId=en&ObjectID=1930820000
footprint SV_7_62HP_180SF_02 (OMNIMATE Power - Serie BV/SV 7.62HP  SV 7.62HP/02/180SF 3.5)
part A pins: A1
part B pins: A2

## 1930830000
designator J?
OMNIMATE Power - series BV/SV 7.62HP; PartNumber: 1930830000; Manufacturer: Weidmueller; Short_text_for_material: SV 7.62HP/03/180SF 3.5SN BK BX; Side_termination_characteristic: Screw/clip-on flange; Mounting_onto_the_PCB: Solder connection; Pitch_mm: 7.62 mm; Pitch_inch: 0.3 inch; No_of_poles: 3; Outgoing_elbow: 180°; Solder_pin_length_mm: 3.5 mm; Contact_material: Cu-Leg; Contact_surface: tinned; Insulating_material: PA GF; UL_94_flammability_rating: V-0; Rated_voltage_for_surge_voltage_class_pollution_degree_II_2: 1000 V; Rated_voltage_use_group_B_UL_1059: 300 V; Rated_current_use_group_B_UL_1059: 40.5 A; PackageReference: SV_7_62HP_180SF_03; Colour: Black; Packaging: Box; Qty: 48 PCS; Revision: V1; ComponentLink1Description: Manufacturer URL; ComponentLink1URL: http://www.weidmueller.com/; ComponentLink2Description: URL Link1; ComponentLink2URL: http://catalog.weidmueller.com/catalog/Start.do?localeId=en&ObjectID=1930830000
footprint SV_7_62HP_180SF_03 (OMNIMATE Power - Serie BV/SV 7.62HP  SV 7.62HP/03/180SF 3.5)
pins: A1, A2, A3

## 1930830000_Single
designator J?
OMNIMATE Power - series BV/SV 7.62HP; PartNumber: 1930830000; Manufacturer: Weidmueller; Short_text_for_material: SV 7.62HP/03/180SF 3.5SN BK BX; Side_termination_characteristic: Screw/clip-on flange; Mounting_onto_the_PCB: Solder connection; Pitch_mm: 7.62 mm; Pitch_inch: 0.3 inch; No_of_poles: 3; Outgoing_elbow: 180°; Solder_pin_length_mm: 3.5 mm; Contact_material: Cu-Leg; Contact_surface: tinned; Insulating_material: PA GF; UL_94_flammability_rating: V-0; Rated_voltage_for_surge_voltage_class_pollution_degree_II_2: 1000 V; Rated_voltage_use_group_B_UL_1059: 300 V; Rated_current_use_group_B_UL_1059: 40.5 A; PackageReference: SV_7_62HP_180SF_03; Colour: Black; Packaging: Box; Qty: 48 PCS; Revision: V1; ComponentLink1Description: Manufacturer URL; ComponentLink1URL: http://www.weidmueller.com/; ComponentLink2Description: URL Link1; ComponentLink2URL: http://catalog.weidmueller.com/catalog/Start.do?localeId=en&ObjectID=1930830000
footprint SV_7_62HP_180SF_03 (OMNIMATE Power - Serie BV/SV 7.62HP  SV 7.62HP/03/180SF 3.5)
part A pins: A1
part B pins: A2
part C pins: A3

## 1930840000
designator J?
OMNIMATE Power - series BV/SV 7.62HP; PartNumber: 1930840000; Manufacturer: Weidmueller; Short_text_for_material: SV 7.62HP/04/180SF 3.5SN BK BX; Side_termination_characteristic: Screw/clip-on flange; Mounting_onto_the_PCB: Solder connection; Pitch_mm: 7.62 mm; Pitch_inch: 0.3 inch; No_of_poles: 4; Outgoing_elbow: 180°; Solder_pin_length_mm: 3.5 mm; Contact_material: Cu-Leg; Contact_surface: tinned; Insulating_material: PA GF; UL_94_flammability_rating: V-0; Rated_voltage_for_surge_voltage_class_pollution_degree_II_2: 1000 V; Rated_voltage_use_group_B_UL_1059: 300 V; Rated_current_use_group_B_UL_1059: 40.5 A; PackageReference: SV_7_62HP_180SF_04; Colour: Black; Packaging: Box; Qty: 100 PCS; Revision: V1; ComponentLink1Description: Manufacturer URL; ComponentLink1URL: http://www.weidmueller.com/; ComponentLink2Description: URL Link1; ComponentLink2URL: http://catalog.weidmueller.com/catalog/Start.do?localeId=en&ObjectID=1930840000
footprint SV_7_62HP_180SF_04 (OMNIMATE Power - Serie BV/SV 7.62HP  SV 7.62HP/04/180SF 3.5)
pins: A1, A2, A3, A4

## 1930840000_Single
designator J?
OMNIMATE Power - series BV/SV 7.62HP; PartNumber: 1930840000; Manufacturer: Weidmueller; Short_text_for_material: SV 7.62HP/04/180SF 3.5SN BK BX; Side_termination_characteristic: Screw/clip-on flange; Mounting_onto_the_PCB: Solder connection; Pitch_mm: 7.62 mm; Pitch_inch: 0.3 inch; No_of_poles: 4; Outgoing_elbow: 180°; Solder_pin_length_mm: 3.5 mm; Contact_material: Cu-Leg; Contact_surface: tinned; Insulating_material: PA GF; UL_94_flammability_rating: V-0; Rated_voltage_for_surge_voltage_class_pollution_degree_II_2: 1000 V; Rated_voltage_use_group_B_UL_1059: 300 V; Rated_current_use_group_B_UL_1059: 40.5 A; PackageReference: SV_7_62HP_180SF_04; Colour: Black; Packaging: Box; Qty: 100 PCS; Revision: V1; ComponentLink1Description: Manufacturer URL; ComponentLink1URL: http://www.weidmueller.com/; ComponentLink2Description: URL Link1; ComponentLink2URL: http://catalog.weidmueller.com/catalog/Start.do?localeId=en&ObjectID=1930840000
footprint SV_7_62HP_180SF_04 (OMNIMATE Power - Serie BV/SV 7.62HP  SV 7.62HP/04/180SF 3.5)
part A pins: A1
part B pins: A2
part C pins: A3
part D pins: A4

## 1931260000
designator J?
OMNIMATE Power - series BV/SV 7.62HP; PartNumber: 1931260000; Manufacturer: Weidmueller; Short_text_for_material: SV 7.62HP/02/270G 3.5SN BK BX; Side_termination_characteristic: closed side; Mounting_onto_the_PCB: Solder connection; Pitch_mm: 7.62 mm; Pitch_inch: 0.3 inch; No_of_poles: 2; Outgoing_elbow: 270°; Solder_pin_length_mm: 3.5 mm; Contact_material: Cu-Leg; Contact_surface: tinned; Insulating_material: PA GF; UL_94_flammability_rating: V-0; Rated_voltage_for_surge_voltage_class_pollution_degree_II_2: 1000 V; Rated_voltage_use_group_B_UL_1059: 300 V; Rated_current_use_group_B_UL_1059: 40.5 A; PackageReference: SV_7_62HP_270G_02; Colour: Black; Packaging: Box; Qty: 120 PCS; Revision: V1; ComponentLink1Description: Manufacturer URL; ComponentLink1URL: http://www.weidmueller.com/; ComponentLink2Description: URL Link1; ComponentLink2URL: http://catalog.weidmueller.com/catalog/Start.do?localeId=en&ObjectID=1931260000
footprint SV_7_62HP_270G_02 (OMNIMATE Power - Serie BV/SV 7.62HP  SV 7.62HP/02/270G 3.5)
pins: A1, A2